# Altium footprint library smdComponent.PcbLib: 182 footprints (part 4 of 12)
Each footprint in its own frame and in the unit in brackets; x right, y up, seen from the top. Pads: shape width x height; smd on the part's side, far side on the other; paste and mask are expansions set on the pad; w line width, h text height; cw(c..) or ccw(c..) is an arc to the next point about the centre after c.
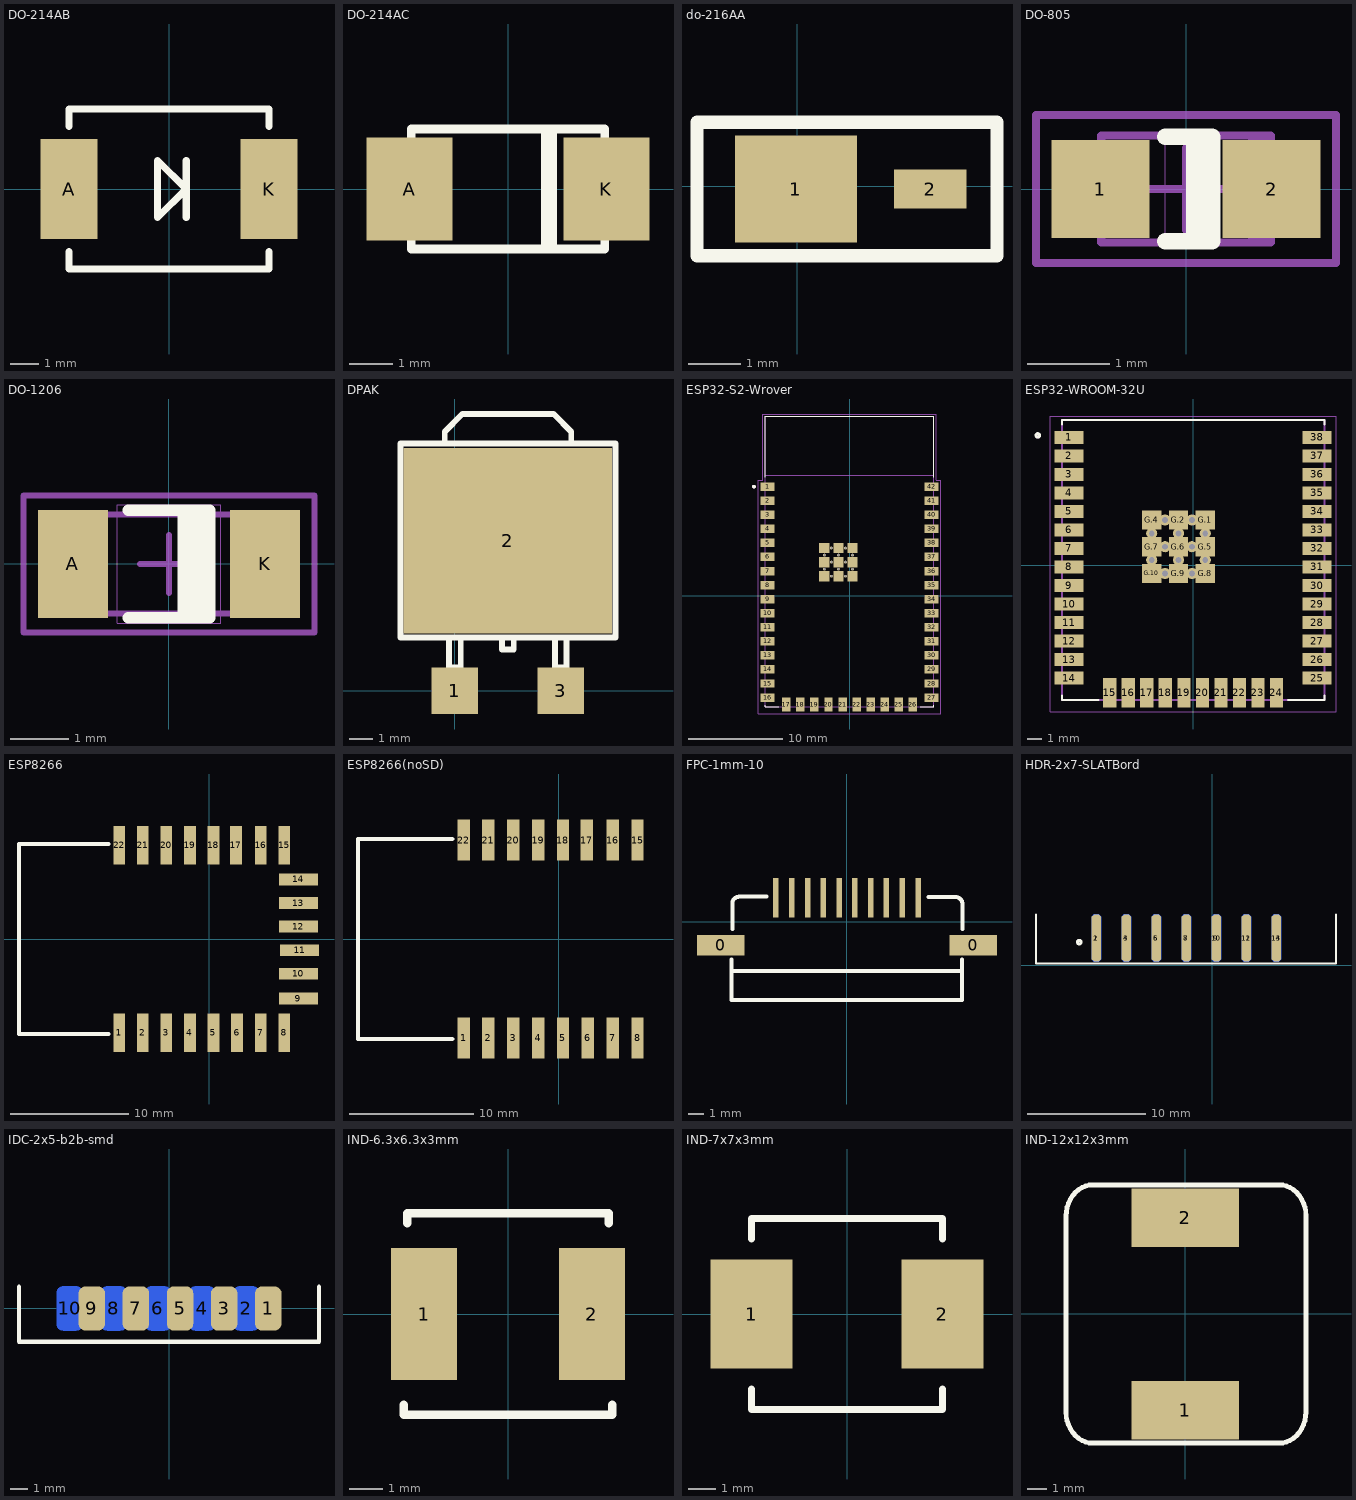
[diagram p3: the footprints below, top view; thin cyan lines are the x and y axes]

## DO-214AB [mm]
pads (2):
  rect 2x3.5 smd: A(-3.5,0) K(3.5,0)
Top Overlay:
  lines w0.254: -3.5,-2.2 -3.5,-2.8 0,-2.8 3.5,-2.8 3.5,-2.2 ; -3.5,2.2 -3.5,2.8 0,2.8 3.5,2.8 3.5,2.2 ; 0.6,-1 0.6,0 ; 0.6,1 0.6,0 ; 0.6,0 -0.4,-1 -0.4,1 0.6,0
3D body "DO-214AB.step": height 2.4, standoff 0.03, extent -4.065,-3 4.065,3.1

## DO-214AC [mm]
height 1.35
pads (2):
  rect 2x2.4 smd: A(-2.286,0) K(2.286,0)
Top Overlay:
  rectangle: 0.762,-1.397 1.143,1.397
  lines w0.203: -2.25,-1.143 -2.25,-1.397 2.25,-1.397 2.25,-1.143 ; -2.25,1.143 -2.25,1.397 2.25,1.397 2.25,1.143
3D body "User Library-DIOM5528X26.STEP": height 2.6, standoff 0.03, extent -2.909,-1.321 2.591,1.479

## do-216AA [mm]
pads (2):
  rect 2.32x2.03 smd: 1(-0.025,-0.051)
  rect 1.38x0.75 smd: 2(2.535,-0.051)
Top Overlay:
  lines w0.254: -1.91,-1.321 3.805,-1.321 3.805,1.219 -1.91,1.219 -1.91,-1.321

## DO-805 [mil] "Molded Diode, 2-Leads, Body 2.0x1.2mm, IPC Medium Density"
height 39
pads (2):
  rect 47x47 smd: 1(-41,0) 2(41,0)
Top Overlay:
  rectangle: 0,-25 12.56,25
  lines w7.87: -10,-25 12.56,-25 12.56,25 -10,25
Mechanical 10:
  lines w0.39: -10,-25 10,-25 10,25 -10,25 -10,-25
Mechanical 13:
  rectangle: 29.64,-25.59 40.55,25.59
  lines w3.94: -40.55,-25.59 -40.55,25.59 40.55,25.59 40.55,-25.59 -40.55,-25.59
Mechanical 15:
  lines w3.94: -19.68,0 19.68,0 ; 0,-19.68 0,19.68 ; -71.85,-35.43 -71.85,35.43 71.85,35.43 71.85,-35.43 -71.85,-35.43
3D body: height 39, standoff 0, extent -40.55,-25.59 40.55,25.59
3D body: height 39.29, standoff 39, extent 18,-22 36,23

## DO-1206 [mm] "MELF Diode, 2-Leads, Body 3.5x1.7mm, IPC Medium Density"
height 1.7
pads (2):
  rect 1.2x1.85 smd: A(-1.65,0) K(1.65,0)
Top Overlay:
  rectangle: 0.15,-0.925 0.7,0.925
  lines w0.2: -0.7,-0.925 0.7,-0.925 0.7,0.925 -0.7,0.925
Mechanical 10:
  lines w0.01: -0.889,-1.016 0.889,-1.016 0.889,1.016 -0.889,1.016 -0.889,-1.016
Mechanical 13:
  rectangle: 1.352,-0.85 1.85,0.85
  lines w0.1: -1.85,-0.85 -1.85,0.85 1.85,0.85 1.85,-0.85 -1.85,-0.85
Mechanical 15:
  lines w0.1: -0.5,0 0.5,0 ; 0,-0.5 0,0.5 ; -2.5,-1.175 -2.5,1.175 2.5,1.175 2.5,-1.175 -2.5,-1.175
3D body: height 1.7, standoff 0, extent -1.85,-0.85 1.85,0.85
3D body: height 1.71, standoff 1.7, extent 1.041,-0.864 1.499,0.864

## DPAK [mm]
pads (3):
  rect 2x2 smd: 1(0,0) 3(4.572,0)
  rect 9x8 smd: 2(2.286,6.477)
Top Overlay:
  lines w0.254: -0.437,10.676 -0.437,11.184 0.325,11.946 4.262,11.946 5.024,11.184 5.024,10.676 ; -0.254,2.286 -0.254,1.016 0.254,1.016 0.254,2.286 ; 2.032,2.286 2.032,1.778 2.54,1.778 2.54,2.286 ; 4.318,2.286 4.318,1.016 4.826,1.016 4.826,2.286 ; -2.342,2.294 6.929,2.294 6.929,10.676 -2.342,10.676 -2.342,2.294
3D body "User Library-DPAK_TO-252AA_.STEP": height 2.42, standoff 0.02, extent -1.081,0.379 5.653,10.479

## ESP32-S2-Wrover [mm]
pads (63):
  rect 1.5x0.9 smd: 1(-8.75,11.625) 2(-8.75,10.125) 3(-8.75,8.625) 4(-8.75,7.125) 5(-8.75,5.625) 6(-8.75,4.125) 7(-8.75,2.625) 8(-8.75,1.125) 9(-8.75,-0.375) 10(-8.75,-1.875) 11(-8.75,-3.375) 12(-8.75,-4.875) 13(-8.75,-6.375) 14(-8.75,-7.875) 15(-8.75,-9.375) 16(-8.75,-10.875) 27(8.75,-10.875) 28(8.75,-9.375) 29(8.75,-7.875) 30(8.75,-6.375) 31(8.75,-4.875) 32(8.75,-3.375) 33(8.75,-1.875) 34(8.75,-0.375) 35(8.75,1.125) 36(8.75,2.625) 37(8.75,4.125) 38(8.75,5.625) 39(8.75,7.125) 40(8.75,8.625) 41(8.75,10.125) 42(8.75,11.625)
  rect 0.9x1.5 smd: 17(-6.75,-11.625) 18(-5.25,-11.625) 19(-3.75,-11.625) 20(-2.25,-11.625) 21(-0.75,-11.625) 22(0.75,-11.625) 23(2.25,-11.625) 24(3.75,-11.625) 25(5.25,-11.625) 26(6.75,-11.625)
  rect 1.1x1.1 smd: 43_1(-2.69,5.075) 43_2(-1.19,5.075) 43_3(0.31,5.075) 43_4(-2.69,3.575) 43_5(-1.19,3.575) 43_6(0.31,3.575) 43_7(-2.69,2.075) 43_8(-1.19,2.075) 43_9(0.31,2.075)
  round 0.3 hole 0.2: 43_10(-1.94,5.075) 43_11(-0.44,5.075) 43_12(-2.69,4.325) 43_13(-1.19,4.325) 43_14(0.31,4.325) 43_15(-1.94,3.575) 43_16(-0.44,3.575) 43_17(-2.69,2.825) 43_18(-1.19,2.825) 43_19(0.31,2.825) 43_20(-1.94,2.075) 43_21(-0.44,2.075)
Top Overlay:
  circle w0.2: c-10.2,11.625 r0.1
  lines w0.127: -9,-11.675 -9,-11.875 -7.55,-11.875 ; -9,12.625 -9,19.125 9,19.125 9,12.625 ; 7.55,-11.875 9,-11.875 9,-11.675
Mechanical 13:
  circle w0.2: c-10.2,11.625 r0.1
  lines w0.127: -9,12.825 9,12.825 ; -9,12.825 -9,19.125 9,19.125 9,12.825 ; -9,12.825 -9,-11.875 9,-11.875 9,12.825
  text "ANTENNA" at -6,15.375 h1.78
Mechanical 15:
  lines w0.05: -9.75,-12.625 -9.75,12.325 -9.25,12.325 -9.25,19.375 9.25,19.375 9.25,12.325 9.75,12.325 9.75,-12.625 -9.75,-12.625
3D body "step_temp.STEP": height 3.3, standoff 0, extent -9.008,-11.899 8.992,19.101

## ESP32-WROOM-32U [mm]
pads (59):
  rect 2x0.9 smd: 1(-8.5,8.755) 2(-8.5,7.485) 3(-8.5,6.215) 4(-8.5,4.945) 5(-8.5,3.675) 6(-8.5,2.405) 7(-8.5,1.135) 8(-8.5,-0.135) 9(-8.5,-1.405) 10(-8.5,-2.675) 11(-8.5,-3.945) 12(-8.5,-5.215) 13(-8.5,-6.485) 14(-8.5,-7.755) 25(8.5,-7.755) 26(8.5,-6.485) 27(8.5,-5.215) 28(8.5,-3.945) 29(8.5,-2.675) 30(8.5,-1.405) 31(8.5,-0.135) 32(8.5,1.135) 33(8.5,2.405) 34(8.5,3.675) 35(8.5,4.945) 36(8.5,6.215) 37(8.5,7.485) 38(8.5,8.755)
  rect 0.9x2 smd: 15(-5.715,-8.755) 16(-4.445,-8.755) 17(-3.175,-8.755) 18(-1.905,-8.755) 19(-0.635,-8.755) 20(0.635,-8.755) 21(1.905,-8.755) 22(3.175,-8.755) 23(4.445,-8.755) 24(5.715,-8.755)
  rect 1.33x1.33 smd: G.1(0.835,3.09) G.2(-1,3.09) G.4(-2.835,3.09) G.5(0.835,1.255) G.6(-1,1.255) G.7(-2.835,1.255) G.8(0.835,-0.58) G.9(-1,-0.58) G.10(-2.835,-0.58)
  round 0.762 hole 0.4: G.11(-0.082,3.09) G.12(-1.917,3.09) G.13(0.835,2.173) G.14(-1,2.173) G.15(-2.835,2.173) G.16(-0.082,1.255) G.17(-1.917,1.255) G.18(0.835,0.337) G.19(-1,0.337) G.20(-2.835,0.337) G.21(-0.082,-0.58) G.22(-1.917,-0.58)
Top Overlay:
  circle w0.2: c-10.65,8.885 r0.121
  lines w0.127: -9,-8.955 -9,-9.255 -6.49,-9.255 ; -9,9.645 -9,9.945 9,9.945 9,9.645 ; 6.49,-9.255 9,-9.255 9,-8.955
Mechanical 13:
  circle w0.2: c-10.65,8.885 r0.1
  lines w0.127: -9,-9.255 -9,9.945 9,9.945 9,-9.255 -9,-9.255
Mechanical 15:
  lines w0.05: -9.8,-10.055 -9.8,10.195 9.8,10.195 9.8,-10.055 -9.8,-10.055
3D body "ESP32-WROOM-32U--3DModel-STEP-56544.STEP": height 3.3, standoff 0, extent -9,-9.255 9,9.945

## ESP8266 [mm]
pads (22):
  rect 1x3.3 smd: 1(-7.65,-7.95) 2(-5.65,-7.95) 3(-3.65,-7.95) 4(-1.65,-7.95) 5(0.35,-7.95) 6(2.35,-7.95) 7(4.35,-7.95) 8(6.35,-7.95) 15(6.35,7.95) 16(4.35,7.95) 17(2.25,7.95) 18(0.35,7.95) 19(-1.65,7.95) 20(-3.65,7.95) 21(-5.65,7.95) 22(-7.65,7.95)
  rect 3.3x1 smd: 9(7.55,-5.05) 10(7.55,-2.95) 11(7.65,-0.95) 12(7.55,1.05) 13(7.55,3.05) 14(7.55,5.05)
Top Overlay:
  lines w0.349: -8.55,-8.05 -16.15,-8.05 -16.15,8.05 -8.55,8.05
3D body "User Library-WIFI - ESP8266M0D.STEP": height 3.12, standoff -0.01, extent -16.176,-8.116 8.034,8.104

## ESP8266(noSD) [mm]
pads (16):
  rect 1x3.3 smd: 1(-7.65,-7.95) 2(-5.65,-7.95) 3(-3.65,-7.95) 4(-1.65,-7.95) 5(0.35,-7.95) 6(2.35,-7.95) 7(4.35,-7.95) 8(6.35,-7.95) 15(6.35,7.95) 16(4.35,7.95) 17(2.25,7.95) 18(0.35,7.95) 19(-1.65,7.95) 20(-3.65,7.95) 21(-5.65,7.95) 22(-7.65,7.95)
Top Overlay:
  lines w0.349: -8.55,-8.05 -16.15,-8.05 -16.15,8.05 -8.55,8.05
3D body "User Library-WIFI - ESP8266M0D.STEP": height 3.12, standoff -0.01, extent -16.176,-8.116 8.034,8.104

## FPC-1mm-10 [mm]
pads (12):
  rect 3x1.3 smd: 0(-8,-1.5) 0(8,-1.5)
  rect 0.35x2.5 smd: 1(-4.5,1.5) 2(-3.5,1.5) 3(-2.5,1.5) 4(-1.5,1.5) 5(-0.5,1.5) 6(0.5,1.5) 7(1.5,1.5) 8(2.5,1.5) 9(3.5,1.5) 10(4.5,1.5)
Top Overlay:
  lines w0.254: -7.315,-3.124 7.29,-3.124 ; -7.315,-2.413 -7.315,-4.953 7.29,-4.953 7.29,-2.413 ; -7.264,-0.457 -7.264,1.143 cw(c-6.833,1.143) -6.833,1.575 -5.105,1.575 ; 5.156,1.549 6.883,1.549 cw(c6.883,1.118) 7.315,1.118 7.315,-0.483
3D body "fpc-10-100-shb-t.stp": height 2.3, standoff 0.05, extent -7.304,-4.954 7.296,1.545

## HDR-2x7-SLATBord [mm]
pads (14):
  oct 0.8x4 smd: 1(-9.804,2.299) 3(-7.264,2.299) 5(-4.724,2.299) 7(-2.184,2.299) 9(0.356,2.299) 11(2.896,2.299) 13(5.436,2.299)
  oct 0.8x4 smd far side: 2(-9.804,2.299) 4(-7.264,2.299) 6(-4.724,2.299) 8(-2.184,2.299) 10(0.356,2.299) 12(2.896,2.299) 14(5.436,2.299)
Top Overlay:
  circle w0.254: c-11.252,1.956 r0.152
  lines w0.2: -14.91,4.293 -14.91,0.14 10.49,0.14 10.49,4.293
3D body "6251.stp": height 2.97, standoff -6.08, extent -11.049,-0.082 6.731,13.767

## IDC-2x5-b2b-smd [mil]
pads (10):
  rrect50% 60x100 smd: 1(225,0) 3(125,0) 5(25,0) 7(-75,0) 9(-175,0)
  rrect50% 60x100 smd far side: 2(175,0) 4(75,0) 6(-25,0) 8(-125,0) 10(-225,0)
Top Overlay:
  lines w10: -340,49 -340,-75 0,-75 340,-75 340,49
3D body "IDC25-b2b.STEP": height 118.11, standoff -157.48, extent -341.52,-42.02 343.52,332

## IND-6.3x6.3x3mm [mm]
pads (2):
  rect 2x4 smd: 1(-2.54,0) 2(2.54,0)
Top Overlay:
  lines w0.254: -3.15,-2.75 -3.15,-3.048 -0.452,-3.048 3.15,-3.048 3.15,-2.75 ; -3.048,2.75 -3.048,3.048 0.452,3.048 3.048,3.048 3.048,2.75
3D body "User Library-b82462g4.STEP": height 3, standoff 0, extent -3.15,-3.15 3.15,3.15

## IND-7x7x3mm [mm]
pads (2):
  rect 3x4 smd: 1(-3.5,0) 2(3.5,0)
Top Overlay:
  lines w0.254: -3.5,-2.75 -3.5,-3.5 0,-3.5 3.5,-3.5 3.5,-2.75 ; -3.5,2.75 -3.5,3.5 0,3.5 3.5,3.5 3.5,2.75
3D body "Line Filter 7_3x7_3x4_2H.step": height 4.3, standoff 0.01, extent -3.7,-3.65 3.7,3.65

## IND-12x12x3mm [mm]
pads (2):
  rect 5.5x3 smd: 1(0,-4.978) 2(0,4.928)
Top Overlay:
  lines w0.254: -6.127,-5.059 ccw(c-4.373,-5.059) -5.613,-6.299 ccw(c-4.755,-5.441) -4.755,-6.655 ; -6.121,-5.029 -6.121,3.296 ; -6.122,-4.83 -6.122,-4.623 ; -6.122,-3.525 -6.122,4.801 -6.122,5.009 cw(c-4.368,5.009) -5.608,6.249 cw(c-4.75,5.39) -4.75,6.604 ; -4.75,-6.655 4.826,-6.655 ccw(c4.826,-5.441) 5.684,-6.299 ccw(c4.445,-5.059) 6.198,-5.059 6.198,-4.851 ; -4.674,6.604 4.831,6.604 cw(c4.831,5.39) 5.69,6.249 cw(c4.45,5.009) 6.203,5.009 6.203,4.801 6.203,-3.525 ; 6.198,-4.902 6.198,3.728
3D body "Inductor_SMD.STEP": height 5.52, standoff 0.02, extent -6.123,-6.225 6.327,6.225